# Altium footprint library AMAP4BPXEVBv2.PcbLib: 58 footprints (part 2 of 4)
Each footprint in its own frame and in the unit in brackets; x right, y up, seen from the top. Pads: shape width x height; smd on the part's side, far side on the other; paste and mask are expansions set on the pad; w line width, h text height; cw(c..) or ccw(c..) is an arc to the next point about the centre after c.
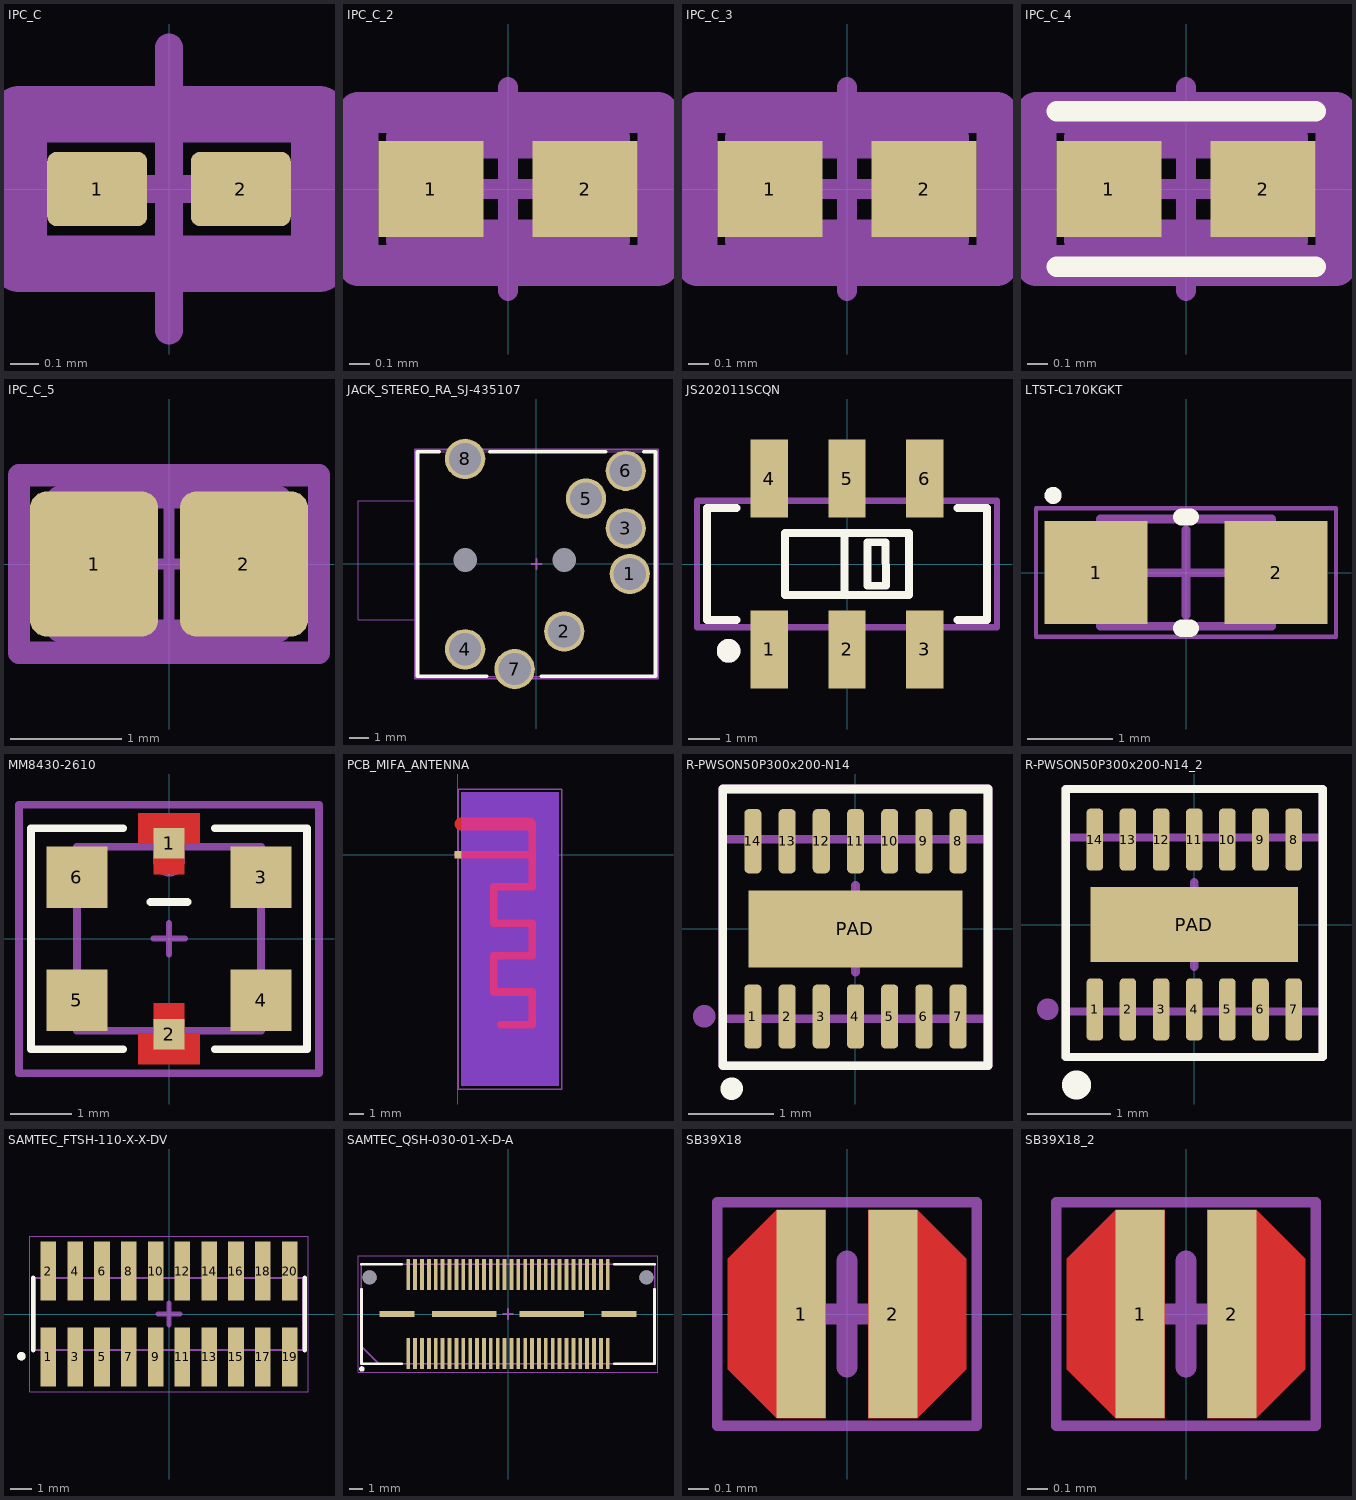
[diagram p1: the footprints below, top view; thin cyan lines are the x and y axes]

## IPC_C [mm]
pads (2):
  rrect25% 0.354x0.263 smd mask+0.025: 1(-0.254,0) 2(0.254,0)
Top Overlay:
  text ".Designator" at -0.605,-0.316 h1.02
Top Assembly:
  lines w0.2: -0.531,-0.265 0.531,-0.265 0.531,0.265 -0.531,0.265 -0.531,-0.265
  text ".Designator" at 3.467,-1.092 h1
Top Courtyard:
  lines w0.2: -0.531,-0.265 0.531,-0.265 0.531,0.265 -0.531,0.265 -0.531,-0.265
Top Component Center:
  lines w0.1: -0.5,0 0.5,0 ; 0,-0.5 0,0.5
3D body: height 0.33, standoff 0, extent 0.165,-0.165 0.315,0.165
3D body: height 0.33, standoff 0, extent -0.315,-0.165 -0.165,0.165
3D body: height 0.33, standoff 0, extent -0.165,-0.165 0.165,0.165

## IPC_C_2 [mm]
pads (2):
  rect 0.515x0.472 smd mask+0.051: 1(-0.379,0) 2(0.379,0)
Top Overlay:
  text ".Designator" at -0.398,-0.277 h1
Top Assembly:
  lines w0.2: -0.736,-0.375 -0.736,0.375 0.736,0.375 0.736,-0.375 -0.736,-0.375
  text ".Designator" at -2.227,-1.293 h1
Top 3D Body:
  lines w0.2: -0.5,-0.25 -0.5,0.25 0.5,0.25 0.5,-0.25 -0.5,-0.25
Top Courtyard:
  lines w0.2: -0.736,-0.375 -0.736,0.375 0.736,0.375 0.736,-0.375 -0.736,-0.375
Top Component Center:
  lines w0.1: -0.5,0 0.5,0 -0.5,0 ; 0,-0.5 0,0.5 0,-0.5
3D body "Cap_Samsung_CL05A105MP5NNNC_eec.STEP": height 0.55, standoff 0, extent -0.5,-0.25 0.5,0.25

## IPC_C_3 [mm]
pads (2):
  rect 0.515x0.472 smd mask+0.051: 1(-0.379,0) 2(0.379,0)
Top Overlay:
  text ".Designator" at -0.525,-0.175 h1
Top Assembly:
  lines w0.2: -0.736,-0.375 0.736,-0.375 0.736,0.375 -0.736,0.375 -0.736,-0.375
  text ".Designator" at -0.558,-0.253 h1
Top 3D Body:
  lines w0.2: -0.5,-0.25 0.5,-0.25 0.5,0.25 -0.5,0.25 -0.5,-0.25
Top Courtyard:
  lines w0.2: -0.736,-0.375 0.736,-0.375 0.736,0.375 -0.736,0.375 -0.736,-0.375
Top Component Center:
  lines w0.1: -0.5,0 0.5,0 -0.5,0 ; 0,-0.5 0,0.5 0,-0.5
3D body "Cap_Samsung_CL05A105MP5NNNC_eec.STEP": height 0.55, standoff 0, extent -0.5,-0.25 0.5,0.25

## IPC_C_4 [mm]
pads (2):
  rect 0.515x0.472 smd paste+0 mask+0.05: 1(-0.379,0) 2(0.379,0)
Top Overlay:
  lines w0.102: -0.635,-0.381 0.637,-0.381 ; -0.635,0.381 0.637,0.381
Top Assembly:
  lines w0.2: -0.736,-0.375 0.736,-0.375 0.736,0.375 -0.736,0.375 -0.736,-0.375
  text ".Designator" at 2.176,1.217 h1
Top 3D Body:
  lines w0.2: -0.5,-0.25 0.5,-0.25 0.5,0.25 -0.5,0.25 -0.5,-0.25
Top Courtyard:
  lines w0.2: -0.736,-0.375 0.736,-0.375 0.736,0.375 -0.736,0.375 -0.736,-0.375
Top Component Center:
  lines w0.1: -0.5,0 0.5,0 ; 0,-0.5 0,0.5
3D body "Ind_Murata_LQG15HN39NJ02D_eec.STEP": height 0.25, standoff 0, extent -0.736,-0.375 0.736,0.375

## IPC_C_5 [mm]
pads (2):
  rrect25% 1.154x1.306 smd mask+0.051: 1(-0.676,0) 2(0.676,0)
Top Overlay:
  text ".Designator" at -2.102,1.274 h1
Top Assembly:
  lines w0.2: -1.353,-0.8 -1.353,0.8 1.353,0.8 1.353,-0.8 -1.353,-0.8
  text ".Designator" at -2.352,-1.776 h1
Top 3D Body:
  lines w0.2: -1,-0.6 -1,0.6 1,0.6 1,-0.6 -1,-0.6
Top Courtyard:
  lines w0.2: -1.353,-0.8 -1.353,0.8 1.353,0.8 1.353,-0.8 -1.353,-0.8
Top Component Center:
  lines w0.1: -0.5,0 0.5,0 ; 0,-0.5 0,0.5
3D body "Ind_Murata_DFE201210U-2R2M=P2_eec.STEP": height 0.25, standoff 0, extent -1.353,-0.8 1.353,0.8

## JACK_STEREO_RA_SJ-435107 [mil] "JACK_STEREO_RA_SJ-435107"
pads (10):
  round 80 hole 64: 1(185.1,-19.75) 2(55.1,-133.85) 3(177.2,70.85) 4(-141.7,-169.35) 5(98.4,129.85) 6(177.2,185.05) 7(-43.3,-208.65) 8(-141.7,208.65)
  round 10 hole 47 unplated: ""(-141.7,7.85) ""(55.1,7.85)
Top Overlay:
  lines w1: -236.2,-222.45 -236.2,222.45 ; 236.2,-222.45 236.2,222.45
  lines w7.1: -192.9,222.45 -236.2,222.45 -236.2,-222.45 -98.4,-222.45 ; -92.5,222.45 137.8,222.45 ; 9.9,-222.45 236.2,-222.45 236.2,222.45 212.6,222.45
  text ".Designator" at 270.7,-218.15 h40
Top Assembly:
  lines w1: -236.2,-110.25 -354.3,-110.25 -354.3,125.95 -236.2,125.95 ; -236.2,-222.45 -236.2,222.45 236.2,222.45 236.2,-222.45 -236.2,-222.45
  text ".Designator" at -14.81,-81.28 h40
Top Courtyard:
  lines w4: -241.2,-227.45 -241.2,227.45 241.2,227.45 241.2,-227.45 -241.2,-227.45
Top Component Center:
  lines w4: -10,0 10,0 ; 0,-10 0,10
3D body: height 250, standoff 0, extent -236.2,-222.45 236.2,222.45
3D body: height 248, standoff 12, extent -354.3,-110.15 -236.3,125.85

## JS202011SCQN [mm]
pads (6):
  rect 1.2x2.5 smd: 1(-2.5,-2.75) 2(0,-2.75) 3(2.5,-2.75) 4(-2.5,2.75) 5(0,2.75) 6(2.5,2.75)
Top Overlay:
  circle w0.508: c-3.81,-2.794 r0.127
  lines w0.254: -3.556,-1.8 -4.5,-1.8 -4.5,1.8 -3.556,1.8 ; -0.08,-1 -0.08,1 ; 3.556,-1.8 4.5,-1.8 4.5,1.8 3.556,1.8 ; -2,-1 -2,1 2,1 2,-1 -2,-1 ; 0.66,-0.7 0.66,0.7 1.24,0.7 1.26,-0.7 0.66,-0.7
Top Assembly:
  circle w0.508: c-3.81,-2.794 r0.127
  lines w0.203: -0.08,-1 -0.08,1 ; -4.826,-2.032 -4.826,2.032 4.826,2.032 4.826,-2.032 -4.826,-2.032 ; -2,-1 2,-1 2,1 -2,1 -2,-1 ; 0.66,-0.7 0.66,0.7 1.24,0.7 1.26,-0.7 0.66,-0.7
  text ".Designator" at -3.008,-3.409 h1.52
3D body "JS.stp": height 3.6, standoff 0, extent -4.6,-3.5 4.6,3.5

## LTST-C170KGKT [mm] "SMD, 2-Leads, Body 2.00x1.25mm"
height 1.1
pads (2):
  rect 1.2x1.2 smd: 1(-1.05,0) 2(1.05,0)
Top Overlay:
  circle w0.1: c-1.55,0.9 r0.05
  lines w0.2: -0.05,-0.65 0.05,-0.65 ; -0.05,0.65 0.05,0.65
Top Assembly:
  rectangle: -1,-0.625 -0.731,0.625
  lines w0.1: -1,-0.625 -1,0.625 1,0.625 1,-0.625 -1,-0.625
  text ".Designator" at 2.289,0.23 h1.02
Top Courtyard:
  lines w0.05: -1.75,-0.75 1.75,-0.75 1.75,0.75 -1.75,0.75 -1.75,-0.75
Top Component Center:
  lines w0.1: -0.5,0 0.5,0 ; 0,-0.5 0,0.5
3D body: height 1.1, standoff 0.5, extent -0.7,-0.625 0.7,0.625
3D body: height 0.5, standoff 0, extent -1,-0.625 1,0.625

## MM8430-2610 [mm] "MM8430-2610"
pads (6):
  rect 0.498x0.498 smd paste+0 mask+0.102: 1(0,1.557)
  rect 0.5x0.5 smd mask+0.102: 2(0,-1.557)
  rect 1.001x1.001 smd mask+0.05: 3(1.501,1.001) 4(1.501,-1.001) 5(-1.501,-1.001) 6(-1.501,1.001)
Top Layer:
  region: 0.249,-1.049 0.249,-1.549 0.5,-1.549 0.5,-2.05 -0.5,-2.05 -0.5,-1.549 -0.249,-1.549 -0.249,-1.049
  region: 0.249,-1.049 0.249,-1.549 0.5,-1.549 0.5,-2.05 -0.5,-2.05 -0.5,-1.549 -0.249,-1.549 -0.249,-1.049
  region: -0.249,1.049 -0.249,1.549 -0.5,1.549 -0.5,2.05 0.5,2.05 0.5,1.549 0.249,1.549 0.249,1.049
Top Overlay:
  lines w0.127: -0.749,-1.801 -2.25,-1.801 -2.25,1.801 -0.749,1.801 ; -0.3,0.6 0.3,0.6 ; 0.749,-1.801 2.25,-1.801 2.25,1.801 0.749,1.801
  text ".Designator" at -3.429,0.381 h1.02
Top Paste:
  region: -0.249,1.049 -0.249,1.549 -0.5,1.549 -0.5,2.05 0.5,2.05 0.5,1.549 0.249,1.549 0.249,1.049
  region: -0.249,1.049 -0.249,1.549 -0.5,1.549 -0.5,2.05 0.5,2.05 0.5,1.549 0.249,1.549 0.249,1.049
  region: 0.249,-1.049 0.249,-1.549 0.5,-1.549 0.5,-2.05 -0.5,-2.05 -0.5,-1.549 -0.249,-1.549 -0.249,-1.049
  region: 0.249,-1.049 0.249,-1.549 0.5,-1.549 0.5,-2.05 -0.5,-2.05 -0.5,-1.549 -0.249,-1.549 -0.249,-1.049
Top Solder:
  region: 0.3,-0.998 0.3,-1.499 0.551,-1.499 0.551,-2.098 -0.551,-2.098 -0.551,-1.499 -0.3,-1.499 -0.3,-0.998
  region: -0.3,0.998 -0.3,1.499 -0.551,1.499 -0.551,2.098 0.551,2.098 0.551,1.499 0.3,1.499 0.3,0.998
Top Assembly:
  circle w0.254: c0,1.27 r0.127
  lines w0.127: -1.501,-1.501 -1.501,1.501 1.501,1.501 1.501,-1.501 -1.501,-1.501
  text ".Designator" at -0.165,2.366 h1.02
Top Courtyard:
  lines w0.127: -2.446,-2.194 -2.446,2.186 2.446,2.186 2.446,-2.194 -2.446,-2.194
Top Component Center:
  lines w0.102: -0.252,0.004 0.256,0.004 ; 0,-0.254 0,0.254
3D body "User Library-MM8430-2610.STEP": height 1.75, standoff 0, extent -1.5,-1.496 1.5,1.504

## PCB_MIFA_ANTENNA [mil] "PCB_MIFA_ANTENNA"
pads (1):
  rect 19x20.7 smd paste+0 mask+4: 1(0,0)
Top Layer:
  lines w20.7: 0.9,0.1 200.9,0.1 ; 115.9,-458.9 200.9,-458.9 200.9,-370.9 96.9,-370.9 96.9,-272.9 200.9,-272.9 200.9,-184.9 96.9,-184.9 96.9,-86.9 200.9,-86.9 200.9,0.1 ; 200.9,83.1 200.9,0.1
  lines w36: 8.9,83.1 192.9,83.1
Top Layer keep-out:
  region: 43.9,124.91 43.9,108.04 11,108.04 11,124.91 11,167.4 268.9,167.4 268.9,-622.6 11,-622.6 11,-22.13 168.9,-22.13 168.9,-56.09 75.99,-56.09 75.99,-211.29 174.01,-211.29 174.01,-248.27 75.99,-248.27 75.99,-397.45 168.9,-397.45 168.9,-432.28 75.99,-432.28 75.99,-485.16 231.19,-485.16 231.19,-340.27 121.99,-340.27 121.99,-295.13 231.19,-295.13 231.19,-160.13 121.99,-160.13 121.99,-113.27 231.19,-113.27 231.19,124.91
  region: 182.89,59.13 182.89,15.91 10.9,15.91 10.9,59.13
Mid-Layer 1 keep-out:
  region: 11,-622.6 271,-622.6 271,167.4 11,167.4
Bottom Layer keep-out:
  region: 11,-622.6 271,-622.6 271,167.4 11,167.4
Top Overlay:
  text ".Designator" at -86.1,168.1 h40
Top Assembly:
  lines w4: 11,-622.6 11,167.4 271,167.4 271,-622.6 11,-622.6
  text "No Assembly Req'd" at 102.51,-45 h40
  text "PCB Antenna" at 160.44,-100 h40
  text ".Designator" at 45,120 h40
Top Courtyard:
  lines w4: 1,-632.6 1,177.4 281,177.4 281,-632.6 1,-632.6
Top Component Center:
  lines w4: -10,0 10,0 ; 0,-10 0,10

## R-PWSON50P300x200-N14 [mm] "Texas Instruments DPU Package"
pads (15):
  rrect50% 0.2x0.75 smd mask+0.05: 1(-1.2,-1.025) 2(-0.8,-1.025) 3(-0.4,-1.025) 4(0,-1.025) 5(0.4,-1.025) 6(0.8,-1.025) 7(1.2,-1.025) 8(1.2,1.025) 9(0.8,1.025) 10(0.4,1.025) 11(0,1.025) 12(-0.4,1.025) 13(-0.8,1.025) 14(-1.2,1.025)
  rect 2.5x0.9 smd paste-1 mask+0.05: PAD(0,0)
Top Overlay:
  circle w0.254: c-1.449,-1.869 r0.004
  lines w0.1: -1.55,-1.6 -1.55,1.636 1.55,1.636 1.55,-1.6 -1.55,-1.6
  text ".Designator" at -1.41,1.939 h1.52
Top Paste:
  rectangle: -1.125,-0.375 -0.125,0.375
  rectangle: 0.125,-0.375 1.125,0.375
Top Assembly:
  circle w0.254: c-1.77,-1.023 r0.004
  lines w0.1: -1.55,-1.05 -1.55,1.05 1.55,1.05 1.55,-1.05 -1.55,-1.05
  text ".Designator" at 3.379,0.463 h1.52
Top Courtyard:
  lines w0.1: -1.55,-1.6 1.55,-1.6 1.55,1.636 -1.55,1.636 -1.55,-1.6
Top Component Center:
  lines w0.102: -0.508,0 0.508,0 ; 0,-0.508 0,0.508
3D body: height 0.8, standoff 0, extent -1.55,-1.05 1.55,1.05

## R-PWSON50P300x200-N14_2 [mm]
pads (15):
  rrect50% 0.2x0.75 smd mask+0.05: 1(-1.2,-1.025) 2(-0.8,-1.025) 3(-0.4,-1.025) 4(0,-1.025) 5(0.4,-1.025) 6(0.8,-1.025) 7(1.2,-1.025) 8(1.2,1.025) 9(0.8,1.025) 10(0.4,1.025) 11(0,1.025) 12(-0.4,1.025) 13(-0.8,1.025) 14(-1.2,1.025)
  rect 2.5x0.9 smd paste-1 mask+0.05: PAD(0,0)
Top Overlay:
  circle w0.254: c-1.421,-1.938 r0.048
  lines w0.1: -1.55,-1.6 1.55,-1.6 1.55,1.636 -1.55,1.636 -1.55,-1.6
  text ".Designator" at 1.65,-2.054 h1.52
Top Paste:
  rectangle: 0.125,-0.375 1.125,0.375
  rectangle: -1.125,-0.375 -0.125,0.375
Top Assembly:
  circle w0.254: c-1.77,-1.023 r0.004
  lines w0.1: -1.55,-1.05 1.55,-1.05 1.55,1.05 -1.55,1.05 -1.55,-1.05
  text ".Designator" at 3.459,0.345 h1.52
Top Courtyard:
  lines w0.1: -1.55,-1.6 -1.55,1.636 1.55,1.636 1.55,-1.6 -1.55,-1.6
Top Component Center:
  lines w0.102: -0.508,0 0.508,0 ; 0,-0.508 0,0.508
3D body: height 0.8, standoff 0, extent -1.55,-1.05 1.55,1.05

## SAMTEC_FTSH-110-X-X-DV [mm]
pads (20):
  rect 0.74x2.79 smd: 1(-5.715,-2.035) 2(-5.715,2.035) 3(-4.445,-2.035) 4(-4.445,2.035) 5(-3.175,-2.035) 6(-3.175,2.035) 7(-1.905,-2.035) 8(-1.905,2.035) 9(-0.635,-2.035) 10(-0.635,2.035) 11(0.635,-2.035) 12(0.635,2.035) 13(1.905,-2.035) 14(1.905,2.035) 15(3.175,-2.035) 16(3.175,2.035) 17(4.445,-2.035) 18(4.445,2.035) 19(5.715,-2.035) 20(5.715,2.035)
Top Overlay:
  circle w0.2: c-7,-2 r0.1
  lines w0.2: -6.435,-1.715 -6.435,1.715 ; 6.435,-1.715 6.435,1.715
  text ".Designator" at -10.902,2.297 h1.52
Top Assembly:
  circle w0.2: c-7,-2 r0.1
  lines w0.1: -6.35,-1.715 -6.35,1.715 6.35,1.715 6.35,-1.715 -6.35,-1.715
  text ".Designator" at -3.434,-0.345 h1.52
Top Courtyard:
  lines w0.05: -6.6,-3.68 -6.6,3.68 6.6,3.68 6.6,-3.68 -6.6,-3.68
Top Component Center:
  lines w0.254: -0.508,0 0.508,0 ; 0,-0.508 0,0.508
3D body "FTSH-110-01-L-DV-K-P-TR.stp": height 6.58, standoff -0.41, extent -6.35,-4.445 6.35,2.921

## SAMTEC_QSH-030-01-X-D-A [mm]
pads (66):
  rect 0.279x2.27 smd mask+0.05: 01(-7.25,-2.865) 02(-7.25,2.865) 03(-6.75,-2.865) 04(-6.75,2.865) 05(-6.25,-2.865) 06(-6.25,2.865) 07(-5.75,-2.865) 08(-5.75,2.865) 09(-5.25,-2.865) 10(-5.25,2.865) 11(-4.75,-2.865) 12(-4.75,2.865) 13(-4.25,-2.865) 14(-4.25,2.865) 15(-3.75,-2.865) 16(-3.75,2.865) 17(-3.25,-2.865) 18(-3.25,2.865) 19(-2.75,-2.865) 20(-2.75,2.865) 21(-2.25,-2.865) 22(-2.25,2.865) 23(-1.75,-2.865) 24(-1.75,2.865) 25(-1.25,-2.865) 26(-1.25,2.865) 27(-0.75,-2.865) 28(-0.75,2.865) 29(-0.25,-2.865) 30(-0.25,2.865) 31(0.25,-2.865) 32(0.25,2.865) 33(0.75,-2.865) 34(0.75,2.865) 35(1.25,-2.865) 36(1.25,2.865) 37(1.75,-2.865) 38(1.75,2.865) 39(2.25,-2.865) 40(2.25,2.865) 41(2.75,-2.865) 42(2.75,2.865) 43(3.25,-2.865) 44(3.25,2.865) 45(3.75,-2.865) 46(3.75,2.865) 47(4.25,-2.865) 48(4.25,2.865) 49(4.75,-2.865) 50(4.75,2.865) 51(5.25,-2.865) 52(5.25,2.865) 53(5.75,-2.865) 54(5.75,2.865) 55(6.25,-2.865) 56(6.25,2.865) 57(6.75,-2.865) 58(6.75,2.865) 59(7.25,-2.865) 60(7.25,2.865)
  rect 2.54x0.43 smd mask+0.05: S1(-8.065,0) S4(8.065,0)
  rect 4.7x0.43 smd mask+0.05: S2(-3.175,0) S3(3.175,0)
  round 1.02 hole 1.02 unplated: ""(-10.065,2.67) ""(10.065,2.67)
Top Overlay:
  circle w0.2: c-10.621,-3.997 r0.1
  lines w0.2: -10.655,1.8 -10.655,-3.62 -7.75,-3.62 ; -10.655,3.62 -7.75,3.62 ; 7.75,-3.62 10.655,-3.62 10.655,1.8 ; 7.75,3.62 10.655,3.62
  text ".Designator" at -11.238,-3.663 h1.52
Top Assembly:
  lines w0.1: -10.655,-3.62 -10.655,3.62 10.655,3.62 10.655,-3.62 -10.655,-3.62
  lines w0.127: -10.667,-2.354 -9.367,-3.653
  text ".Designator" at 0.218,-3.485 h1.52
Top Courtyard:
  lines w0.05: -10.905,-4.25 10.905,-4.25 10.905,4.25 -10.905,4.25 -10.905,-4.25
Top Component Center:
  lines w0.127: -0.381,0 0.381,0 ; 0,-0.381 0,0.381
3D body "QSH-030-01-L-D-A--3DModel-STEP-56544.STEP": height 3.05, standoff -0.95, extent -10.635,-3.747 10.635,3.747

## SB39X18 [mm] "SB39X18"
pads (2):
  rect 0.236x1 smd paste+0 mask+0.102: 1(-0.22,0) 2(0.22,0)
Top Layer:
  region: 0.572,0.264 0.572,-0.264 0.338,-0.5 0.102,-0.5 0.102,0.5 0.338,0.5
  region: 0.572,0.264 0.572,-0.264 0.338,-0.5 0.102,-0.5 0.102,0.5 0.338,0.5
  region: -0.572,-0.264 -0.572,0.264 -0.338,0.5 -0.102,0.5 -0.102,-0.5 -0.338,-0.5
  region: -0.572,-0.264 -0.572,0.264 -0.338,0.5 -0.102,0.5 -0.102,-0.5 -0.338,-0.5
Top Overlay:
  text ".Designator" at -2.396,-0.33 h1.02
Top Solder:
  region: 0.622,-0.279 0.622,0.279 0.366,0.536 0,0.536 0,-0.536 0.366,-0.536
  region: 0.622,-0.279 0.622,0.279 0.366,0.536 0,0.536 0,-0.536 0.366,-0.536
  region: -0.622,0.279 -0.622,-0.279 -0.366,-0.536 0,-0.536 0,0.536 -0.366,0.536
  region: -0.622,0.279 -0.622,-0.279 -0.366,-0.536 0,-0.536 0,0.536 -0.366,0.536
Top Assembly:
  lines w0.051: -0.622,-0.536 0.622,-0.536 0.622,0.536 -0.622,0.536 -0.622,-0.536
  text "Solderbridge" at -0.508,0.292 h0.2
  text ".Designator" at -0.72,0.838 h1.02
  text "No Assembly Req'd" at -0.622,-0.536 h0.2
Top Courtyard:
  lines w0.025: -0.622,-0.536 -0.622,0.536 0.622,0.536 0.622,-0.536 -0.622,-0.536
Top Component Center:
  lines w0.102: -0.254,0 0.254,0 ; 0,-0.254 0,0.254

## SB39X18_2 [mm]
pads (2):
  rect 0.236x1 smd paste+0 mask+0.102: 1(-0.22,0) 2(0.22,0)
Top Layer:
  region: 0.572,0.264 0.572,-0.264 0.338,-0.5 0.102,-0.5 0.102,0.5 0.338,0.5
  region: 0.572,0.264 0.572,-0.264 0.338,-0.5 0.102,-0.5 0.102,0.5 0.338,0.5
  region: -0.572,-0.264 -0.572,0.264 -0.338,0.5 -0.102,0.5 -0.102,-0.5 -0.338,-0.5
  region: -0.572,-0.264 -0.572,0.264 -0.338,0.5 -0.102,0.5 -0.102,-0.5 -0.338,-0.5
Top Overlay:
  text ".Designator" at 2.515,0.279 h1.02
Top Solder:
  region: 0.622,-0.279 0.622,0.279 0.366,0.536 0,0.536 0,-0.536 0.366,-0.536
  region: 0.622,-0.279 0.622,0.279 0.366,0.536 0,0.536 0,-0.536 0.366,-0.536
  region: -0.622,0.279 -0.622,-0.279 -0.366,-0.536 0,-0.536 0,0.536 -0.366,0.536
  region: -0.622,0.279 -0.622,-0.279 -0.366,-0.536 0,-0.536 0,0.536 -0.366,0.536
Top Assembly:
  lines w0.051: -0.622,-0.536 0.622,-0.536 0.622,0.536 -0.622,0.536 -0.622,-0.536
  text "Solderbridge" at -0.508,0.292 h0.2
  text ".Designator" at 0.838,-0.787 h1.02
  text "No Assembly Req'd" at -0.622,-0.536 h0.2
Top Courtyard:
  lines w0.025: -0.622,-0.536 -0.622,0.536 0.622,0.536 0.622,-0.536 -0.622,-0.536
Top Component Center:
  lines w0.102: -0.254,0 0.254,0 ; 0,-0.254 0,0.254